# Altium footprint library Molex FFC - FPC Connectors (SMT).PcbLib: 638 footprints (part 28 of 40)
Each footprint in its own frame and in the unit in brackets; x right, y up, seen from the top. Pads: shape width x height; smd on the part's side, far side on the other; paste and mask are expansions set on the pad; w line width, h text height; cw(c..) or ccw(c..) is an arc to the next point about the centre after c.
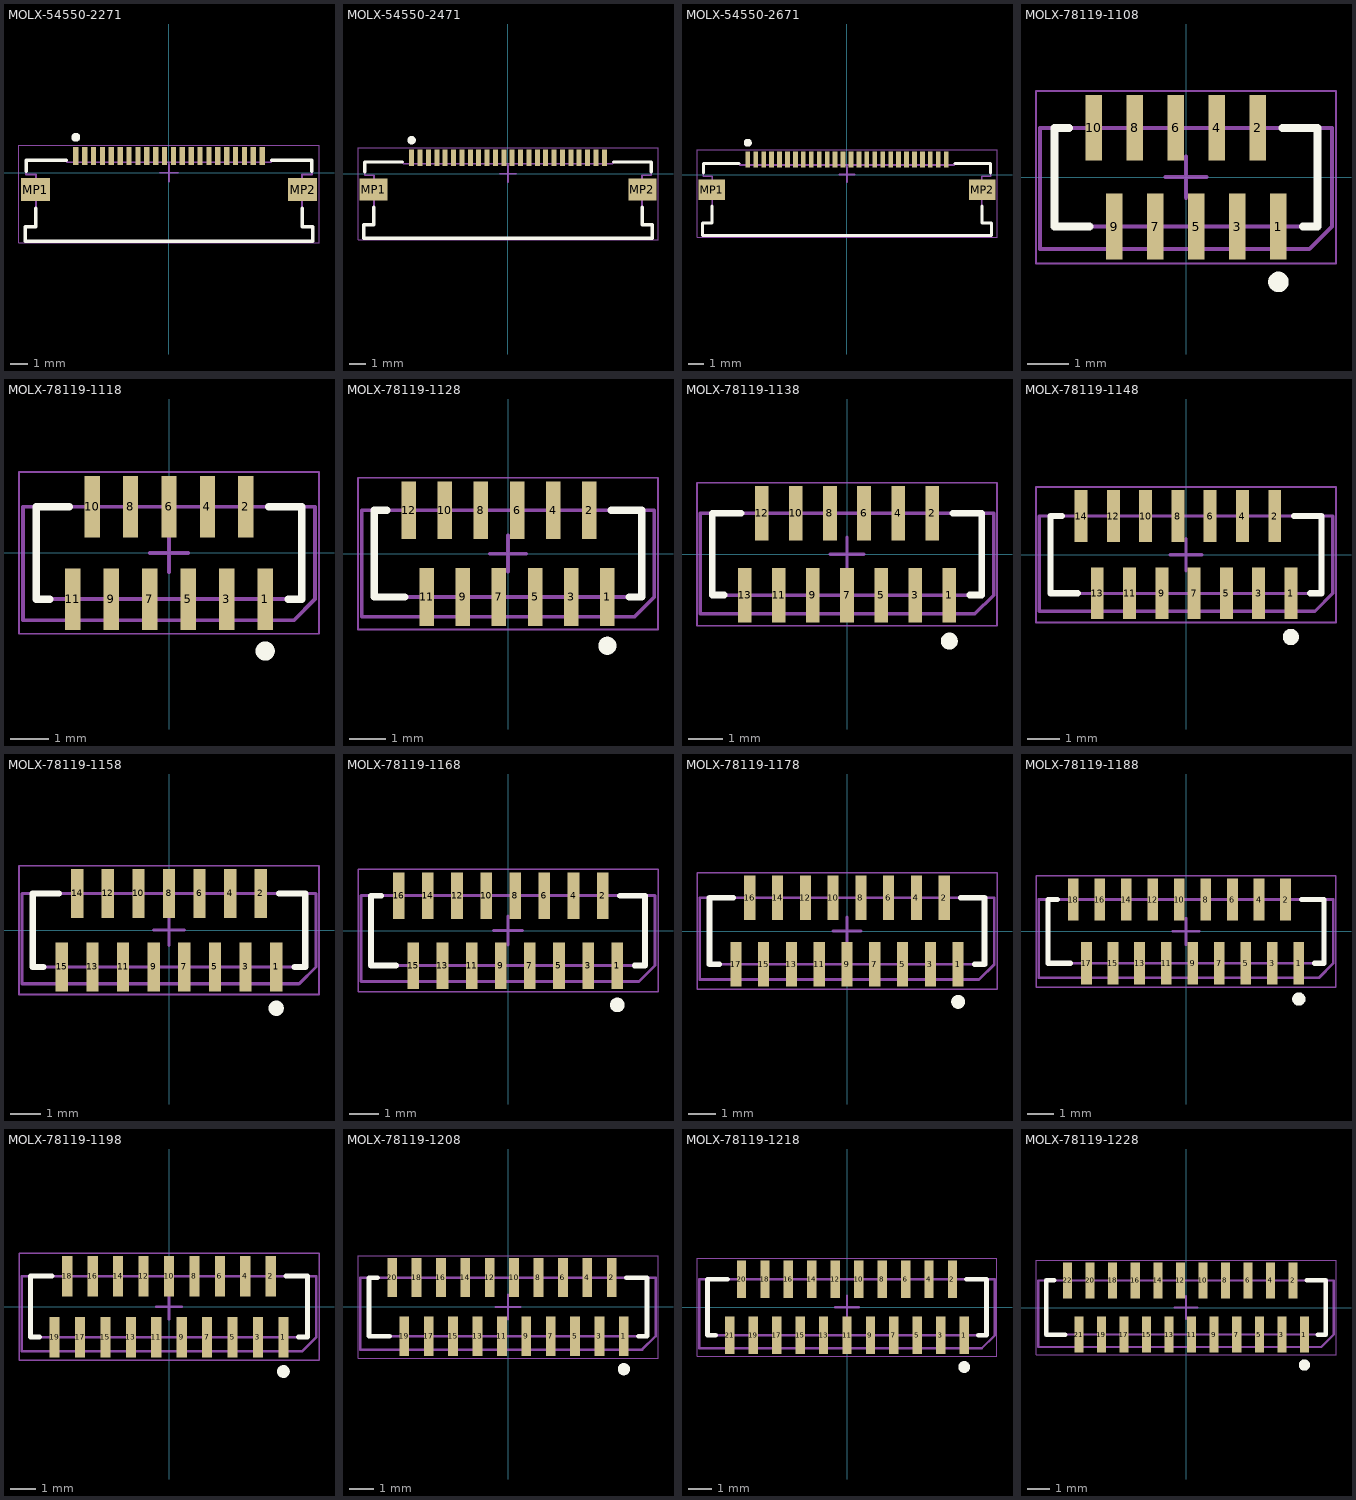
[diagram p27: the footprints below, top view; thin cyan lines are the x and y axes]

## MOLX-54550-2271 [mm] "FPC Connector, 22-Leads, Right Angle, Pitch 0.5 mm, Mated Height 1.2 mm, SMT"
height 1.212
pads (24):
  rect 0.3x1 smd: 1(-5.25,0.95) 2(-4.75,0.95) 3(-4.25,0.95) 4(-3.75,0.95) 5(-3.25,0.95) 6(-2.75,0.95) 7(-2.25,0.95) 8(-1.75,0.95) 9(-1.25,0.95) 10(-0.75,0.95) 11(-0.25,0.95) 12(0.25,0.95) 13(0.75,0.95) 14(1.25,0.95) 15(1.75,0.95) 16(2.25,0.95) 17(2.75,0.95) 18(3.25,0.95) 19(3.75,0.95) 20(4.25,0.95) 21(4.75,0.95) 22(5.25,0.95)
  rect 1.65x1.3 smd: MP1(-7.525,-0.95) MP2(7.525,-0.95)
Top Overlay:
  circle w0.25: c-5.25,2 r0.125
  lines w0.2: -8.1,-3.85 -8.1,-3.05 -7.5,-3.05 -7.5,-2 ; -8.1,-3.85 8.1,-3.85 ; -8.05,0.1 -8.05,0.7 -5.8,0.7 ; 5.8,0.7 8.05,0.7 8.05,0.1 ; 7.5,-2 7.5,-3.05 8.1,-3.05 8.1,-3.85
Mechanical 13:
  lines w0.1: -8.1,-3.85 -8.1,-3.05 -7.5,-3.05 -7.5,-0.1 -8.05,-0.1 -8.05,0.7 -5.75,0.7 -5.75,0.6 5.75,0.6 5.75,0.7 8.05,0.7 8.05,-0.1 7.5,-0.1 7.5,-3.05 8.1,-3.05 8.1,-3.85 -8.1,-3.85
Mechanical 15:
  lines w0.05: -8.45,-3.95 -8.45,1.55 8.45,1.55 8.45,-3.95 -8.45,-3.95
  lines w0.1: -0.5,0 0.5,0 ; 0,-0.5 0,0.5
3D body: height 0.25, standoff 0, extent -8.1,-3.85 8.1,1.15

## MOLX-54550-2471 [mm] "FPC Connector, 24-Leads, Right Angle, Pitch 0.5 mm, Mated Height 1.2 mm, SMT"
height 1.212
pads (26):
  rect 0.3x1 smd: 1(-5.75,0.95) 2(-5.25,0.95) 3(-4.75,0.95) 4(-4.25,0.95) 5(-3.75,0.95) 6(-3.25,0.95) 7(-2.75,0.95) 8(-2.25,0.95) 9(-1.75,0.95) 10(-1.25,0.95) 11(-0.75,0.95) 12(-0.25,0.95) 13(0.25,0.95) 14(0.75,0.95) 15(1.25,0.95) 16(1.75,0.95) 17(2.25,0.95) 18(2.75,0.95) 19(3.25,0.95) 20(3.75,0.95) 21(4.25,0.95) 22(4.75,0.95) 23(5.25,0.95) 24(5.75,0.95)
  rect 1.65x1.3 smd: MP1(-8.025,-0.95) MP2(8.025,-0.95)
Top Overlay:
  circle w0.25: c-5.75,2 r0.125
  lines w0.2: -8.6,-3.85 -8.6,-3.05 -8,-3.05 -8,-2 ; -8.6,-3.85 8.6,-3.85 ; -8.55,0.1 -8.55,0.7 -6.3,0.7 ; 6.3,0.7 8.55,0.7 8.55,0.1 ; 8,-2 8,-3.05 8.6,-3.05 8.6,-3.85
Mechanical 13:
  lines w0.1: -8.6,-3.85 -8.6,-3.05 -8,-3.05 -8,-0.1 -8.55,-0.1 -8.55,0.7 -6.25,0.7 -6.25,0.6 6.25,0.6 6.25,0.7 8.55,0.7 8.55,-0.1 8,-0.1 8,-3.05 8.6,-3.05 8.6,-3.85 -8.6,-3.85
Mechanical 15:
  lines w0.05: -8.95,-3.95 -8.95,1.55 8.95,1.55 8.95,-3.95 -8.95,-3.95
  lines w0.1: -0.5,0 0.5,0 ; 0,-0.5 0,0.5
3D body: height 0.25, standoff 0, extent -8.6,-3.85 8.6,1.15

## MOLX-54550-2671 [mm] "FPC Connector, 26-Leads, Right Angle, Pitch 0.5 mm, Mated Height 1.2 mm, SMT"
height 1.212
pads (28):
  rect 0.3x1 smd: 1(-6.25,0.95) 2(-5.75,0.95) 3(-5.25,0.95) 4(-4.75,0.95) 5(-4.25,0.95) 6(-3.75,0.95) 7(-3.25,0.95) 8(-2.75,0.95) 9(-2.25,0.95) 10(-1.75,0.95) 11(-1.25,0.95) 12(-0.75,0.95) 13(-0.25,0.95) 14(0.25,0.95) 15(0.75,0.95) 16(1.25,0.95) 17(1.75,0.95) 18(2.25,0.95) 19(2.75,0.95) 20(3.25,0.95) 21(3.75,0.95) 22(4.25,0.95) 23(4.75,0.95) 24(5.25,0.95) 25(5.75,0.95) 26(6.25,0.95)
  rect 1.65x1.3 smd: MP1(-8.525,-0.95) MP2(8.525,-0.95)
Top Overlay:
  circle w0.25: c-6.25,2 r0.125
  lines w0.2: -9.1,-3.85 -9.1,-3.05 -8.5,-3.05 -8.5,-2 ; -9.1,-3.85 9.1,-3.85 ; -9.05,0.1 -9.05,0.7 -6.8,0.7 ; 6.8,0.7 9.05,0.7 9.05,0.1 ; 8.5,-2 8.5,-3.05 9.1,-3.05 9.1,-3.85
Mechanical 13:
  lines w0.1: -9.1,-3.85 -9.1,-3.05 -8.5,-3.05 -8.5,-0.1 -9.05,-0.1 -9.05,0.7 -6.75,0.7 -6.75,0.6 6.75,0.6 6.75,0.7 9.05,0.7 9.05,-0.1 8.5,-0.1 8.5,-3.05 9.1,-3.05 9.1,-3.85 -9.1,-3.85
Mechanical 15:
  lines w0.05: -9.45,-3.95 9.45,-3.95 9.45,1.55 -9.45,1.55 -9.45,-3.95
  lines w0.1: -0.5,0 0.5,0 ; 0,-0.5 0,0.5
3D body: height 0.25, standoff 0, extent -9.1,-3.85 9.1,1.15

## MOLX-78119-1108 [mm] "FPC Connector, 10-Leads, Vertical, Pitch 0.5 mm, Mated Height 4.1 mm, SMT"
height 4.112
pads (10):
  rect 0.4x1.6 smd: 1(2.25,-1.2) 2(1.75,1.2) 3(1.25,-1.2) 4(0.75,1.2) 5(0.25,-1.2) 6(-0.25,1.2) 7(-0.75,-1.2) 8(-1.25,1.2) 9(-1.75,-1.2) 10(-2.25,1.2)
Top Overlay:
  circle w0.25: c2.25,-2.55 r0.125
  lines w0.2: -2.85,1.2 -3.2,1.2 -3.2,-1.2 -2.35,-1.2 ; 2.35,1.2 3.2,1.2 3.2,-1.2 2.85,-1.2
Mechanical 13:
  lines w0.1: -3.55,1.2 3.2,1.2 ; -3.55,1.2 -3.55,-1.75 3,-1.75 3.55,-1.2 3.55,1.2 3.2,1.2 ; -3.55,1.2 -3.2,1.2 -3.2,-1.2 3.2,-1.2 3.2,1.2
Mechanical 15:
  lines w0.05: -3.65,-2.1 3.65,-2.1 3.65,2.1 -3.65,2.1 -3.65,-2.1
  lines w0.1: -0.5,0 0.5,0 ; 0,-0.5 0,0.5
3D body: height 0.25, standoff 0, extent -3.55,-1.75 3.55,1.7

## MOLX-78119-1118 [mm] "FPC Connector, 11-Leads, Vertical, Pitch 0.5 mm, Mated Height 4.1 mm, SMT"
height 4.1
pads (11):
  rect 0.4x1.6 smd: 1(2.5,-1.2) 2(2,1.2) 3(1.5,-1.2) 4(1,1.2) 5(0.5,-1.2) 6(0,1.2) 7(-0.5,-1.2) 8(-1,1.2) 9(-1.5,-1.2) 10(-2,1.2) 11(-2.5,-1.2)
Top Overlay:
  circle w0.25: c2.5,-2.55 r0.125
  lines w0.2: -3.1,-1.2 -3.45,-1.2 -3.45,1.2 -2.6,1.2 ; 2.6,1.2 3.45,1.2 3.45,-1.2 3.1,-1.2
Mechanical 13:
  lines w0.1: -3.45,1.2 -3.8,1.2 -3.8,-1.75 3.25,-1.75 3.8,-1.2 3.8,1.2 3.45,1.2 ; -3.45,1.2 -3.45,-1.2 3.45,-1.2 3.45,1.2 ; -3.45,1.2 3.45,1.2
Mechanical 15:
  lines w0.05: -3.9,-2.1 -3.9,2.1 3.9,2.1 3.9,-2.1 -3.9,-2.1
  lines w0.1: -0.5,0 0.5,0 ; 0,-0.5 0,0.5
3D body: height 0.25, standoff 0, extent -3.8,-1.75 3.8,1.7

## MOLX-78119-1128 [mm] "FPC Connector, 12-Leads, Vertical, Pitch 0.5 mm, Mated Height 4.1 mm, SMT"
height 4.1
pads (12):
  rect 0.4x1.6 smd: 1(2.75,-1.2) 2(2.25,1.2) 3(1.75,-1.2) 4(1.25,1.2) 5(0.75,-1.2) 6(0.25,1.2) 7(-0.25,-1.2) 8(-0.75,1.2) 9(-1.25,-1.2) 10(-1.75,1.2) 11(-2.25,-1.2) 12(-2.75,1.2)
Top Overlay:
  circle w0.25: c2.75,-2.55 r0.125
  lines w0.2: -3.35,1.2 -3.7,1.2 -3.7,-1.2 -2.85,-1.2 ; 2.85,1.2 3.7,1.2 3.7,-1.2 3.35,-1.2
Mechanical 13:
  lines w0.1: -3.7,1.2 -4.05,1.2 -4.05,-1.75 3.5,-1.75 4.05,-1.2 4.05,1.2 3.7,1.2 ; -3.7,1.2 -3.7,-1.2 3.7,-1.2 3.7,1.2 ; -3.7,1.2 3.7,1.2
Mechanical 15:
  lines w0.05: -4.15,-2.1 -4.15,2.1 4.15,2.1 4.15,-2.1 -4.15,-2.1
  lines w0.1: -0.5,0 0.5,0 ; 0,-0.5 0,0.5
3D body: height 0.25, standoff 0, extent -4.05,-1.75 4.05,1.7

## MOLX-78119-1138 [mm] "FPC Connector, 13-Leads, Vertical, Pitch 0.5 mm, Mated Height 4.1 mm, SMT"
height 4.1
pads (13):
  rect 0.4x1.6 smd: 1(3,-1.2) 2(2.5,1.2) 3(2,-1.2) 4(1.5,1.2) 5(1,-1.2) 6(0.5,1.2) 7(0,-1.2) 8(-0.5,1.2) 9(-1,-1.2) 10(-1.5,1.2) 11(-2,-1.2) 12(-2.5,1.2) 13(-3,-1.2)
Top Overlay:
  circle w0.25: c3,-2.55 r0.125
  lines w0.2: -3.6,-1.2 -3.95,-1.2 -3.95,1.2 -3.1,1.2 ; 3.1,1.2 3.95,1.2 3.95,-1.2 3.6,-1.2
Mechanical 13:
  lines w0.1: -3.95,1.2 -4.3,1.2 -4.3,-1.75 3.75,-1.75 4.3,-1.2 4.3,1.2 3.95,1.2 ; -3.95,1.2 -3.95,-1.2 3.95,-1.2 3.95,1.2 ; -3.95,1.2 3.95,1.2
Mechanical 15:
  lines w0.05: -4.4,-2.1 -4.4,2.1 4.4,2.1 4.4,-2.1 -4.4,-2.1
  lines w0.1: -0.5,0 0.5,0 ; 0,-0.5 0,0.5
3D body: height 0.25, standoff 0, extent -4.3,-1.75 4.3,1.7

## MOLX-78119-1148 [mm] "FPC Connector, 14-Leads, Vertical, Pitch 0.5 mm, Mated Height 4.1 mm, SMT"
height 4.1
pads (14):
  rect 0.4x1.6 smd: 1(3.25,-1.2) 2(2.75,1.2) 3(2.25,-1.2) 4(1.75,1.2) 5(1.25,-1.2) 6(0.75,1.2) 7(0.25,-1.2) 8(-0.25,1.2) 9(-0.75,-1.2) 10(-1.25,1.2) 11(-1.75,-1.2) 12(-2.25,1.2) 13(-2.75,-1.2) 14(-3.25,1.2)
Top Overlay:
  circle w0.25: c3.25,-2.55 r0.125
  lines w0.2: -3.85,1.2 -4.2,1.2 -4.2,-1.2 -3.35,-1.2 ; 3.35,1.2 4.2,1.2 4.2,-1.2 3.85,-1.2
Mechanical 13:
  lines w0.1: -4.2,1.2 -4.55,1.2 -4.55,-1.75 4,-1.75 4.55,-1.2 4.55,1.2 4.2,1.2 ; -4.2,1.2 -4.2,-1.2 4.2,-1.2 4.2,1.2 ; -4.2,1.2 4.2,1.2
Mechanical 15:
  lines w0.05: -4.65,-2.1 -4.65,2.1 4.65,2.1 4.65,-2.1 -4.65,-2.1
  lines w0.1: -0.5,0 0.5,0 ; 0,-0.5 0,0.5
3D body: height 0.25, standoff 0, extent -4.55,-1.75 4.55,1.7

## MOLX-78119-1158 [mm] "FPC Connector, 15-Leads, Vertical, Pitch 0.5 mm, Mated Height 4.1 mm, SMT"
height 4.1
pads (15):
  rect 0.4x1.6 smd: 1(3.5,-1.2) 2(3,1.2) 3(2.5,-1.2) 4(2,1.2) 5(1.5,-1.2) 6(1,1.2) 7(0.5,-1.2) 8(0,1.2) 9(-0.5,-1.2) 10(-1,1.2) 11(-1.5,-1.2) 12(-2,1.2) 13(-2.5,-1.2) 14(-3,1.2) 15(-3.5,-1.2)
Top Overlay:
  circle w0.25: c3.5,-2.55 r0.125
  lines w0.2: -4.1,-1.2 -4.45,-1.2 -4.45,1.2 -3.6,1.2 ; 3.6,1.2 4.45,1.2 4.45,-1.2 4.1,-1.2
Mechanical 13:
  lines w0.1: -4.45,1.2 -4.8,1.2 -4.8,-1.75 4.25,-1.75 4.8,-1.2 4.8,1.2 4.45,1.2 ; -4.45,1.2 -4.45,-1.2 4.45,-1.2 4.45,1.2 ; -4.45,1.2 4.45,1.2
Mechanical 15:
  lines w0.05: -4.9,-2.1 -4.9,2.1 4.9,2.1 4.9,-2.1 -4.9,-2.1
  lines w0.1: -0.5,0 0.5,0 ; 0,-0.5 0,0.5
3D body: height 0.25, standoff 0, extent -4.8,-1.75 4.8,1.7

## MOLX-78119-1168 [mm] "FPC Connector, 16-Leads, Vertical, Pitch 0.5 mm, Mated Height 4.1 mm, SMT"
height 4.1
pads (16):
  rect 0.4x1.6 smd: 1(3.75,-1.2) 2(3.25,1.2) 3(2.75,-1.2) 4(2.25,1.2) 5(1.75,-1.2) 6(1.25,1.2) 7(0.75,-1.2) 8(0.25,1.2) 9(-0.25,-1.2) 10(-0.75,1.2) 11(-1.25,-1.2) 12(-1.75,1.2) 13(-2.25,-1.2) 14(-2.75,1.2) 15(-3.25,-1.2) 16(-3.75,1.2)
Top Overlay:
  circle w0.25: c3.75,-2.55 r0.125
  lines w0.2: -4.35,1.2 -4.7,1.2 -4.7,-1.2 -3.85,-1.2 ; 3.85,1.2 4.7,1.2 4.7,-1.2 4.35,-1.2
Mechanical 13:
  lines w0.1: -4.7,1.2 -5.05,1.2 -5.05,-1.75 4.5,-1.75 5.05,-1.2 5.05,1.2 4.7,1.2 ; -4.7,1.2 -4.7,-1.2 4.7,-1.2 4.7,1.2 ; -4.7,1.2 4.7,1.2
Mechanical 15:
  lines w0.05: -5.15,-2.1 -5.15,2.1 5.15,2.1 5.15,-2.1 -5.15,-2.1
  lines w0.1: -0.5,0 0.5,0 ; 0,-0.5 0,0.5
3D body: height 0.25, standoff 0, extent -5.05,-1.75 5.05,1.7

## MOLX-78119-1178 [mm] "FPC Connector, 17-Leads, Vertical, Pitch 0.5 mm, Mated Height 4.1 mm, SMT"
height 4.1
pads (17):
  rect 0.4x1.6 smd: 1(4,-1.2) 2(3.5,1.2) 3(3,-1.2) 4(2.5,1.2) 5(2,-1.2) 6(1.5,1.2) 7(1,-1.2) 8(0.5,1.2) 9(0,-1.2) 10(-0.5,1.2) 11(-1,-1.2) 12(-1.5,1.2) 13(-2,-1.2) 14(-2.5,1.2) 15(-3,-1.2) 16(-3.5,1.2) 17(-4,-1.2)
Top Overlay:
  circle w0.25: c4,-2.55 r0.125
  lines w0.2: -4.6,-1.2 -4.95,-1.2 -4.95,1.2 -4.1,1.2 ; 4.1,1.2 4.95,1.2 4.95,-1.2 4.6,-1.2
Mechanical 13:
  lines w0.1: -4.95,1.2 -5.3,1.2 -5.3,-1.75 4.75,-1.75 5.3,-1.2 5.3,1.2 4.95,1.2 ; -4.95,1.2 -4.95,-1.2 4.95,-1.2 4.95,1.2 ; -4.95,1.2 4.95,1.2
Mechanical 15:
  lines w0.05: -5.4,-2.1 -5.4,2.1 5.4,2.1 5.4,-2.1 -5.4,-2.1
  lines w0.1: -0.5,0 0.5,0 ; 0,-0.5 0,0.5
3D body: height 0.25, standoff 0, extent -5.3,-1.75 5.3,1.7

## MOLX-78119-1188 [mm] "FPC Connector, 18-Leads, Vertical, Pitch 0.5 mm, Mated Height 4.1 mm, SMT"
height 4.1
pads (18):
  rect 0.4x1.6 smd: 1(4.25,-1.2) 2(3.75,1.2) 3(3.25,-1.2) 4(2.75,1.2) 5(2.25,-1.2) 6(1.75,1.2) 7(1.25,-1.2) 8(0.75,1.2) 9(0.25,-1.2) 10(-0.25,1.2) 11(-0.75,-1.2) 12(-1.25,1.2) 13(-1.75,-1.2) 14(-2.25,1.2) 15(-2.75,-1.2) 16(-3.25,1.2) 17(-3.75,-1.2) 18(-4.25,1.2)
Top Overlay:
  circle w0.25: c4.25,-2.55 r0.125
  lines w0.2: -4.85,1.2 -5.2,1.2 -5.2,-1.2 -4.35,-1.2 ; 4.35,1.2 5.2,1.2 5.2,-1.2 4.85,-1.2
Mechanical 13:
  lines w0.1: -5.2,1.2 5.2,1.2 ; -5.2,1.2 -5.2,-1.2 5.2,-1.2 5.2,1.2 ; -5.2,1.2 -5.55,1.2 -5.55,-1.75 5,-1.75 5.55,-1.2 5.55,1.2 5.2,1.2
Mechanical 15:
  lines w0.05: -5.65,-2.1 5.65,-2.1 5.65,2.1 -5.65,2.1 -5.65,-2.1
  lines w0.1: -0.5,0 0.5,0 ; 0,-0.5 0,0.5
3D body: height 0.25, standoff 0, extent -5.55,-1.75 5.55,1.7

## MOLX-78119-1198 [mm] "FPC Connector, 19-Leads, Vertical, Pitch 0.5 mm, Mated Height 4.1 mm, SMT"
height 4.1
pads (19):
  rect 0.4x1.6 smd: 1(4.5,-1.2) 2(4,1.2) 3(3.5,-1.2) 4(3,1.2) 5(2.5,-1.2) 6(2,1.2) 7(1.5,-1.2) 8(1,1.2) 9(0.5,-1.2) 10(0,1.2) 11(-0.5,-1.2) 12(-1,1.2) 13(-1.5,-1.2) 14(-2,1.2) 15(-2.5,-1.2) 16(-3,1.2) 17(-3.5,-1.2) 18(-4,1.2) 19(-4.5,-1.2)
Top Overlay:
  circle w0.25: c4.5,-2.55 r0.125
  lines w0.2: -5.1,-1.2 -5.45,-1.2 -5.45,1.2 -4.6,1.2 ; 4.6,1.2 5.45,1.2 5.45,-1.2 5.1,-1.2
Mechanical 13:
  lines w0.1: -5.45,1.2 -5.8,1.2 -5.8,-1.75 5.25,-1.75 5.8,-1.2 5.8,1.2 5.45,1.2 ; -5.45,1.2 -5.45,-1.2 5.45,-1.2 5.45,1.2 ; -5.45,1.2 5.45,1.2
Mechanical 15:
  lines w0.05: -5.9,-2.1 -5.9,2.1 5.9,2.1 5.9,-2.1 -5.9,-2.1
  lines w0.1: -0.5,0 0.5,0 ; 0,-0.5 0,0.5
3D body: height 0.25, standoff 0, extent -5.8,-1.75 5.8,1.7

## MOLX-78119-1208 [mm] "FPC Connector, 20-Leads, Vertical, Pitch 0.5 mm, Mated Height 4.1 mm, SMT"
height 4.1
pads (20):
  rect 0.4x1.6 smd: 1(4.75,-1.2) 2(4.25,1.2) 3(3.75,-1.2) 4(3.25,1.2) 5(2.75,-1.2) 6(2.25,1.2) 7(1.75,-1.2) 8(1.25,1.2) 9(0.75,-1.2) 10(0.25,1.2) 11(-0.25,-1.2) 12(-0.75,1.2) 13(-1.25,-1.2) 14(-1.75,1.2) 15(-2.25,-1.2) 16(-2.75,1.2) 17(-3.25,-1.2) 18(-3.75,1.2) 19(-4.25,-1.2) 20(-4.75,1.2)
Top Overlay:
  circle w0.25: c4.75,-2.55 r0.125
  lines w0.2: -5.35,1.2 -5.7,1.2 -5.7,-1.2 -4.85,-1.2 ; 4.85,1.2 5.7,1.2 5.7,-1.2 5.35,-1.2
Mechanical 13:
  lines w0.1: -5.7,1.2 -6.05,1.2 -6.05,-1.75 5.5,-1.75 6.05,-1.2 6.05,1.2 5.7,1.2 ; -5.7,1.2 -5.7,-1.2 5.7,-1.2 5.7,1.2 ; -5.7,1.2 5.7,1.2
Mechanical 15:
  lines w0.05: -6.15,-2.1 -6.15,2.1 6.15,2.1 6.15,-2.1 -6.15,-2.1
  lines w0.1: -0.5,0 0.5,0 ; 0,-0.5 0,0.5
3D body: height 0.25, standoff 0, extent -6.05,-1.75 6.05,1.7

## MOLX-78119-1218 [mm] "FPC Connector, 21-Leads, Vertical, Pitch 0.5 mm, Mated Height 4.1 mm, SMT"
height 4.1
pads (21):
  rect 0.4x1.6 smd: 1(5,-1.2) 2(4.5,1.2) 3(4,-1.2) 4(3.5,1.2) 5(3,-1.2) 6(2.5,1.2) 7(2,-1.2) 8(1.5,1.2) 9(1,-1.2) 10(0.5,1.2) 11(0,-1.2) 12(-0.5,1.2) 13(-1,-1.2) 14(-1.5,1.2) 15(-2,-1.2) 16(-2.5,1.2) 17(-3,-1.2) 18(-3.5,1.2) 19(-4,-1.2) 20(-4.5,1.2) 21(-5,-1.2)
Top Overlay:
  circle w0.25: c5,-2.55 r0.125
  lines w0.2: -5.6,-1.2 -5.95,-1.2 -5.95,1.2 -5.1,1.2 ; 5.1,1.2 5.95,1.2 5.95,-1.2 5.6,-1.2
Mechanical 13:
  lines w0.1: -5.95,1.2 -6.3,1.2 -6.3,-1.75 5.75,-1.75 6.3,-1.2 6.3,1.2 5.95,1.2 ; -5.95,1.2 -5.95,-1.2 5.95,-1.2 5.95,1.2 ; -5.95,1.2 5.95,1.2
Mechanical 15:
  lines w0.05: -6.4,-2.1 -6.4,2.1 6.4,2.1 6.4,-2.1 -6.4,-2.1
  lines w0.1: -0.5,0 0.5,0 ; 0,-0.5 0,0.5
3D body: height 0.25, standoff 0, extent -6.3,-1.75 6.3,1.7

## MOLX-78119-1228 [mm] "FPC Connector, 22-Leads, Vertical, Pitch 0.5 mm, Mated Height 4.1 mm, SMT"
height 4.1
pads (22):
  rect 0.4x1.6 smd: 1(5.25,-1.2) 2(4.75,1.2) 3(4.25,-1.2) 4(3.75,1.2) 5(3.25,-1.2) 6(2.75,1.2) 7(2.25,-1.2) 8(1.75,1.2) 9(1.25,-1.2) 10(0.75,1.2) 11(0.25,-1.2) 12(-0.25,1.2) 13(-0.75,-1.2) 14(-1.25,1.2) 15(-1.75,-1.2) 16(-2.25,1.2) 17(-2.75,-1.2) 18(-3.25,1.2) 19(-3.75,-1.2) 20(-4.25,1.2) 21(-4.75,-1.2) 22(-5.25,1.2)
Top Overlay:
  circle w0.25: c5.25,-2.55 r0.125
  lines w0.2: -5.85,1.2 -6.2,1.2 -6.2,-1.2 -5.35,-1.2 ; 5.35,1.2 6.2,1.2 6.2,-1.2 5.85,-1.2
Mechanical 13:
  lines w0.1: -6.2,1.2 -6.55,1.2 -6.55,-1.75 6,-1.75 6.55,-1.2 6.55,1.2 6.2,1.2 ; -6.2,1.2 -6.2,-1.2 6.2,-1.2 6.2,1.2 ; -6.2,1.2 6.2,1.2
Mechanical 15:
  lines w0.05: -6.65,-2.1 -6.65,2.1 6.65,2.1 6.65,-2.1 -6.65,-2.1
  lines w0.1: -0.5,0 0.5,0 ; 0,-0.5 0,0.5
3D body: height 0.25, standoff 0, extent -6.55,-1.75 6.55,1.7